# Altium footprint library connector.PcbLib: 209 footprints (part 7 of 14)
Each footprint in its own frame and in the unit in brackets; x right, y up, seen from the top. Pads: shape width x height; smd on the part's side, far side on the other; paste and mask are expansions set on the pad; w line width, h text height; cw(c..) or ccw(c..) is an arc to the next point about the centre after c.
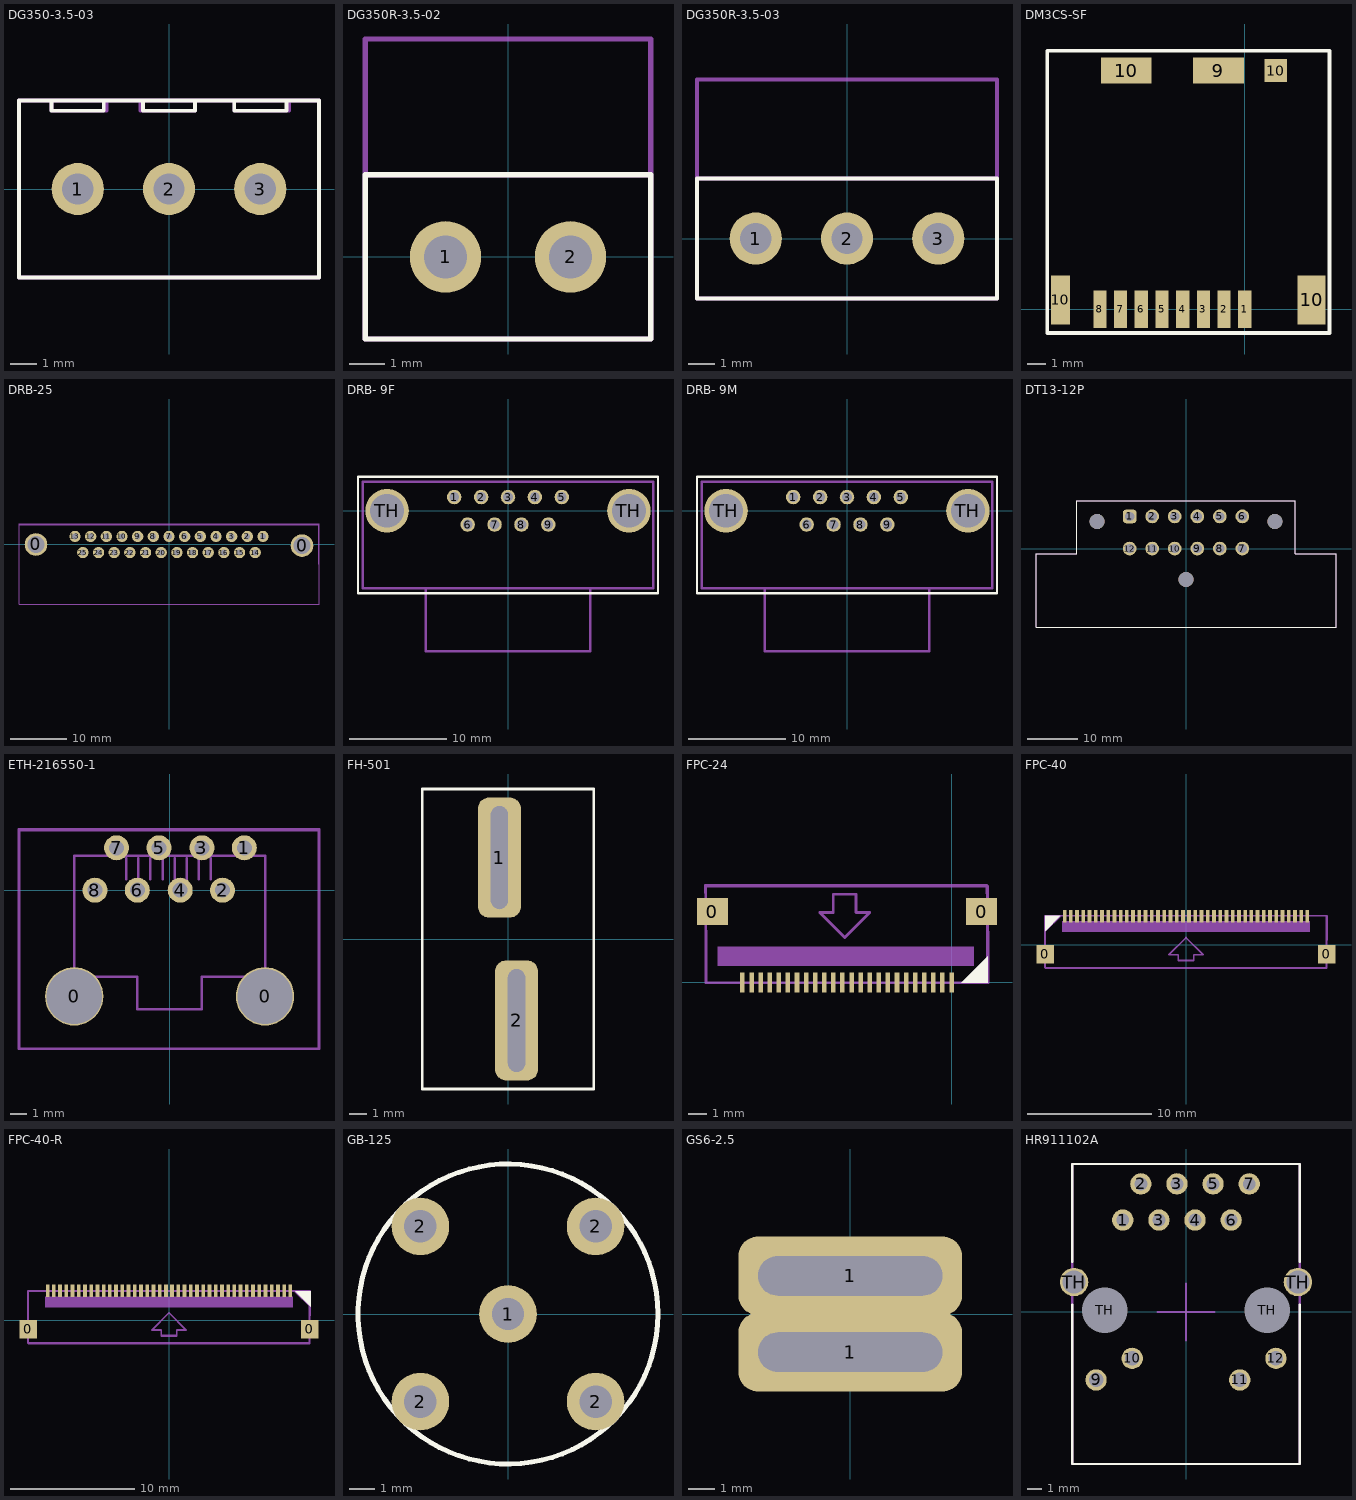
[diagram p6: the footprints below, top view; thin cyan lines are the x and y axes]

## DG350-3.5-03 [mm]
height 10
pads (3):
  round 2 hole 1.2: 1(-3.5,0) 2(0,0) 3(3.5,0)
Top Overlay:
  lines w0.15: -4.5,3.4 -4.5,3 -2.5,3 -2.5,3.4 ; -1,3.4 -1,3 1,3 1,3.4 ; 2.5,3.4 2.5,3 4.5,3 4.5,3.4 ; -5.75,-3.4 5.75,-3.4 5.75,3.4 -5.75,3.4 -5.75,-3.4
Mechanical 29:
  lines w0.15: -4.5,3.4 -4.5,3 -2.4,3 -2.4,3.4 ; -1.1,3.4 -1.1,3 1,3 1,3.4 ; 2.5,3.4 2.5,3 4.6,3 4.6,3.4 ; -5.75,-3.4 -5.75,3.4 5.75,3.4 5.75,-3.4 -5.75,-3.4
  text ".Designator" at -3.5,-0.3 h1
3D body "DG350-3,5-02P.step": height 8.4, standoff -3.4, extent -5.75,-3.4 2.25,3.4
3D body "DG350-3,5-02P.step": height 8.4, standoff -3.4, extent -2.25,-3.4 5.75,3.4

## DG350R-3.5-02 [mm]
height 7
pads (2):
  round 2 hole 1.2: 1(-1.75,0) 2(1.75,0)
Top Overlay:
  lines w0.15: -4,-2.3 4,-2.3 4,2.3 -4,2.3 -4,-2.3
Mechanical 29:
  lines w0.15: -4,2.3 4,2.3 ; -4,-2.3 4,-2.3 4,6.1 -4,6.1 -4,-2.3
  text ".Designator" at -3,-0.3 h1

## DG350R-3.5-03 [mm]
height 7
pads (3):
  round 2 hole 1.2: 1(-3.5,0) 2(0,0) 3(3.5,0)
Top Overlay:
  lines w0.15: -5.75,-2.3 -5.75,2.3 5.75,2.3 5.75,-2.3 -5.75,-2.3
Mechanical 29:
  lines w0.15: -5.75,2.3 5.75,2.3 ; -5.75,-2.3 -5.75,6.1 5.75,6.1 5.75,-2.3 -5.75,-2.3
  text ".Designator" at -3.5,-0.3 h1

## DM3CS-SF [mm] "Hirose,  10 (8 + 2) Position Card Connector Secure Digital - microSDпїЅ Surface Mount, Right Angle Gold"
height 1.83
pads (13):
  rect 0.7x2 smd: 1(0,0) 2(-1.1,0) 3(-2.2,0) 4(-3.3,0) 5(-4.4,0) 6(-5.5,0) 7(-6.6,0) 8(-7.7,0)
  rect 2.7x1.4 smd: 9(-1.4,12.7) 10(-6.3,12.7)
  rect 1x2.6 smd: 10(-9.8,0.5)
  rect 1.2x1.2 smd: 10(1.65,12.7)
  rect 1.5x2.6 smd: 10(3.55,0.5)
Top Overlay:
  lines w0.2: -10.5,-1.25 4.5,-1.25 4.5,13.75 -10.5,13.75 -10.5,-1.25
3D body "DM3CS-SF.stp": height 1.93, standoff 0, extent -9.9,-0.727 3.9,13.373

## DRB-25 [mm]
height 12.5
pads (27):
  round 4 hole 3: 0(-23.52,0) 0(23.52,-0.2)
  round 2 hole 1: 1(16.62,1.42) 2(13.85,1.42) 3(11.08,1.42) 4(8.31,1.42) 5(5.54,1.42) 6(2.77,1.42) 7(0,1.42) 8(-2.77,1.42) 9(-5.54,1.42) 10(-8.31,1.42) 11(-11.08,1.42) 12(-13.85,1.42) 13(-16.62,1.42) 14(15.24,-1.42) 15(12.47,-1.42) 16(9.7,-1.42) 17(6.93,-1.42) 18(4.16,-1.42) 19(1.39,-1.42) 20(-1.38,-1.42) 21(-4.15,-1.42) 22(-6.92,-1.42) 23(-9.69,-1.42) 24(-12.46,-1.42) 25(-15.23,-1.42)
Mechanical 29:
  lines w0.15: -26.5,-3.5 -26.5,3.5 26.5,3.5 26.5,-3.5 ; -26.52,-10.6 -26.52,3.7 26.52,3.7 26.52,-10.6 -26.52,-10.6
  text ".Designator" at -3.5,-3.8 h1
3D body "DB-25S-1A5N-A191-A197.STEP": height 13.77, standoff -3.48, extent -26.55,-17.13 26.55,3.4

## DRB- 9F [mm]
height 12.5
pads (11):
  round 1.5 hole 1: 1(-5.56,1.42) 2(-2.78,1.42) 3(0,1.42) 4(2.78,1.42) 5(5.56,1.42) 6(-4.17,-1.42) 7(-1.39,-1.42) 8(1.39,-1.42) 9(4.17,-1.42)
  round 4.5 hole 3.5: TH(-12.5,0) TH(12.5,0)
Top Overlay:
  lines w0.254: -15.5,-8.5 -15.5,3.5 15.5,3.5 15.5,-8.5 -15.5,-8.5
Mechanical 29:
  lines w0.254: -8.5,-8 -8.5,-14.5 8.5,-14.5 8.5,-8 ; -15,-8 -15,3 15,3 15,-8 -15,-8
  text ".Designator" at -6,-6 h1.52
3D body "DB-9F.step": height 12.75, standoff -3.65, extent -15.25,-13.5 15.25,3.2

## DRB- 9M [mm]
height 12.5
pads (11):
  round 1.5 hole 1: 1(-5.56,1.42) 2(-2.78,1.42) 3(0,1.42) 4(2.78,1.42) 5(5.56,1.42) 6(-4.17,-1.42) 7(-1.39,-1.42) 8(1.39,-1.42) 9(4.17,-1.42)
  round 4.5 hole 3.5: TH(-12.5,0) TH(12.5,0)
Top Overlay:
  lines w0.254: -15.5,-8.5 -15.5,3.5 15.5,3.5 15.5,-8.5 -15.5,-8.5
Mechanical 29:
  lines w0.254: -8.5,-8 -8.5,-14.5 8.5,-14.5 8.5,-8 ; -15,-8 -15,3 15,3 15,-8 -15,-8
  text ".Designator" at -6,-6 h1.52
3D body "DRB-9MB.STEP": height 12.6, standoff -3.2, extent -15.4,-16.4 15.4,3.4

## DT13-12P [mm]
pads (15):
  rrect50% 2.715x2.715 hole 1.81: 1(-11.115,6.35)
  round 2.715 hole 1.81: 2(-6.67,6.35) 3(-2.225,6.35) 4(2.225,6.35) 5(6.67,6.35) 6(11.115,6.35) 7(11.115,0) 8(6.67,0) 9(2.225,0) 10(-2.225,0) 11(-6.67,0) 12(-11.115,0)
  round 2.99 hole 2.99 unplated: ""(-17.54,5.34) ""(0,-6.1) ""(17.54,5.34)
Top Overlay:
  lines w0.15: -29.605,-15.49 -20.28,-15.49 20.28,-15.49 29.605,-15.49 29.605,-1 21.605,-1 21.605,9.4 -21.605,9.4 -21.605,-1 -29.605,-1 -29.605,-15.49
  text "." at -11.521,10.029 h0.1
Top Courtyard:
  lines w0.127: -29.605,-15.49 -20.28,-15.49 20.28,-15.49 29.605,-15.49 29.605,-1 21.605,-1 21.605,9.4 -21.605,9.4 -21.605,-1 -29.605,-1 -29.605,-15.49
3D body "c-dt13-12pb-d-3d.stp": height 33.65, standoff -4.98, extent -29.577,-30.312 29.605,9.312

## ETH-216550-1 [mm]
pads (10):
  round 3.5 hole 3.3: 0(-5.715,-6.36) 0(5.715,-6.36)
  round 1.5 hole 0.9: 1(4.475,2.54) 2(3.175,0) 3(1.935,2.54) 4(0.635,0) 5(-0.635,2.54) 6(-1.935,0) 7(-3.175,2.54) 8(-4.475,0)
Mechanical 29:
  lines w0.15: -2.6,0.65 -2.6,1.925 ; -1.875,0.65 -1.875,1.925 ; -1.15,0.65 -1.15,1.925 ; -0.425,0.65 -0.425,1.925 ; 0.3,0.65 0.3,1.925 ; 1.025,0.65 1.025,1.925 ; 1.75,0.65 1.75,1.925 ; 2.475,0.65 2.475,1.925 ; -9.025,-9.5 8.95,-9.5 ; -9.025,-9.5 -9.025,3.6 8.95,3.6 8.95,-9.5 ; -9.025,-9.5 8.95,-9.5 ; -9.025,-9.5 -9.025,3.65 8.95,3.65 8.95,-9.5 ; -5.715,-5.2 -1.935,-5.2 -1.935,-7.125 1.935,-7.125 1.935,-5.2 5.715,-5.2 5.715,2.05 -5.715,2.05 -5.715,-5.2
  text ".Designator" at -3.5,-2.8 h1
3D body "c-216550-1.STEP": height 16.5, standoff -3.1, extent -9.05,-9.625 8.95,3.075

## FH-501 [mm]
pads (2):
  rrect50% 2.5x7 hole 6 slot 1 at 0 deg: 1(-0.5,4.75) 2(0.5,-4.75)
Top Overlay:
  lines w0.15: -5,-8.75 5,-8.75 5,8.75 -5,8.75 -5,-8.75
3D body "FH-501.stp": height 15, standoff -7, extent -5,-18.5 5,19

## FPC-24 [mm]
pads (26):
  rect 1.7x1.5 smd: 0(-13.15,3.9) 0(1.65,3.9)
  rect 0.25x1.1 smd: 1(0,0) 2(-0.5,0) 3(-1,0) 4(-1.5,0) 5(-2,0) 6(-2.5,0) 7(-3,0) 8(-3.5,0) 9(-4,0) 10(-4.5,0) 11(-5,0) 12(-5.5,0) 13(-6,0) 14(-6.5,0) 15(-7,0) 16(-7.5,0) 17(-8,0) 18(-8.5,0) 19(-9,0) 20(-9.5,0) 21(-10,0) 22(-10.5,0) 23(-11,0) 24(-11.5,0)
Top Overlay:
  region: 0.525,-0.025 2,-0.025 2,1.45
Mechanical 29:
  rectangle: -12.875,0.9 1.225,1.975
  region: 2,1.275 1.975,1.25 1.975,-0.025 0.7,-0.025
  lines w0.15: -13.55,4.925 -13.55,5.325 1.95,5.325 1.95,4.9 ; -13.5,2.85 -13.5,-0.025 -11.825,-0.025 ; 0.325,-0.025 2,-0.025 2,2.8 ; -7.25,3.85 -5.875,2.475 ; -7.25,3.85 -6.5,3.85 ; -7.25,3.85 -5.875,2.475 ; -7.25,3.85 -6.5,3.85 ; -6.5,3.85 -6.5,4.85 ; -6.5,3.85 -6.5,4.85 ; -6.5,4.85 -5.25,4.85 ; -6.5,4.85 -5.25,4.85 ; -5.875,2.475 -4.5,3.85 ; -5.875,2.475 -4.5,3.85 ; -5.25,3.85 -5.25,4.85 ; -5.25,3.85 -4.5,3.85 ; -5.25,3.85 -5.25,4.85 ; -5.25,3.85 -4.5,3.85 ; -13.525,-0.025 -13.525,5.3 1.975,5.3 1.975,-0.025 -13.525,-0.025
  text ".Designator" at -12.5,3.2 h1

## FPC-40 [mm]
pads (42):
  rect 1.4x1.5 smd: 0(-11.3,-0.75) 0(11.3,-0.75)
  rect 0.3x1 smd: 1(-9.75,2.3) 2(-9.25,2.3) 3(-8.75,2.3) 4(-8.25,2.3) 5(-7.75,2.3) 6(-7.25,2.3) 7(-6.75,2.3) 8(-6.25,2.3) 9(-5.75,2.3) 10(-5.25,2.3) 11(-4.75,2.3) 12(-4.25,2.3) 13(-3.75,2.3) 14(-3.25,2.3) 15(-2.75,2.3) 16(-2.25,2.3) 17(-1.75,2.3) 18(-1.25,2.3) 19(-0.75,2.3) 20(-0.25,2.3) 21(0.25,2.3) 22(0.75,2.3) 23(1.25,2.3) 24(1.75,2.3) 25(2.25,2.3) 26(2.75,2.3) 27(3.25,2.3) 28(3.75,2.3) 29(4.25,2.3) 30(4.75,2.3) 31(5.25,2.3) 32(5.75,2.3) 33(6.25,2.3) 34(6.75,2.3) 35(7.25,2.3) 36(7.75,2.3) 37(8.25,2.3) 38(8.75,2.3) 39(9.25,2.3) 40(9.75,2.3)
Top Overlay:
  region: -11.325,1.1 -11.325,2.325 -10.1,2.325
Mechanical 29:
  region: 9.95,1.9 -9.975,1.9 -9.975,1.025 9.95,1.025
  region: -11.3,1.025 -11.275,1.05 -11.275,2.325 -10,2.325
  lines w0.15: -11.325,0.375 -11.325,2.325 ; -11.3,-1.875 -0.55,-1.875 11.3,-1.875 ; -10.2,2.325 -11.325,2.325 ; 10.2,2.325 11.325,2.325 11.325,0.375 ; -11.325,2.325 11.3,2.325 11.3,-1.85 -11.325,-1.85 -11.325,2.325 ; -1.375,-0.8 -0.625,-0.8 ; -1.375,-0.8 0,0.575 ; -1.375,-0.8 -0.625,-0.8 ; -1.375,-0.8 0,0.575 ; -0.625,-0.8 -0.625,-1.275 0.625,-1.275 0.625,-0.8 ; -0.625,-0.8 -0.625,-1.25 0.625,-1.25 0.625,-0.8 ; 0,0.575 1.375,-0.8 ; 0,0.575 1.375,-0.8 ; 0.625,-0.8 1.375,-0.8 ; 0.625,-0.8 1.375,-0.8
  text ".Designator" at -8.5,-0.675 h1
3D body "FPC-40.STEP": height 1.2, standoff -0.02, extent -11.025,-0.95 10.975,2.05

## FPC-40-R [mm]
pads (42):
  rect 1.4x1.5 smd: 0(-11.3,-0.75) 0(11.3,-0.75)
  rect 0.3x1 smd: 1(9.75,2.35) 2(9.25,2.35) 3(8.75,2.35) 4(8.25,2.35) 5(7.75,2.35) 6(7.25,2.35) 7(6.75,2.35) 8(6.25,2.35) 9(5.75,2.35) 10(5.25,2.35) 11(4.75,2.35) 12(4.25,2.35) 13(3.75,2.35) 14(3.25,2.35) 15(2.75,2.35) 16(2.25,2.35) 17(1.75,2.35) 18(1.25,2.35) 19(0.75,2.35) 20(0.25,2.35) 21(-0.25,2.35) 22(-0.75,2.35) 23(-1.25,2.35) 24(-1.75,2.35) 25(-2.25,2.35) 26(-2.75,2.35) 27(-3.25,2.35) 28(-3.75,2.35) 29(-4.25,2.35) 30(-4.75,2.35) 31(-5.25,2.35) 32(-5.75,2.35) 33(-6.25,2.35) 34(-6.75,2.35) 35(-7.25,2.35) 36(-7.75,2.35) 37(-8.25,2.35) 38(-8.75,2.35) 39(-9.25,2.35) 40(-9.75,2.35)
Top Overlay:
  region: 10.142,2.308 11.367,2.308 11.367,1.083
Mechanical 29:
  region: 9.95,1.9 -9.975,1.9 -9.975,1.025 9.95,1.025
  region: 10.067,2.283 10.092,2.258 11.367,2.258 11.367,0.983
  lines w0.15: -11.325,0.375 -11.325,2.325 ; -11.3,-1.875 -0.55,-1.875 11.3,-1.875 ; -10.2,2.325 -11.325,2.325 ; 10.2,2.325 11.325,2.325 11.325,0.375 ; -11.325,2.325 11.3,2.325 11.3,-1.85 -11.325,-1.85 -11.325,2.325 ; -1.375,-0.8 -0.625,-0.8 ; -1.375,-0.8 0,0.575 ; -1.375,-0.8 -0.625,-0.8 ; -1.375,-0.8 0,0.575 ; -0.625,-0.8 -0.625,-1.25 0.625,-1.25 0.625,-0.8 ; -0.625,-0.8 -0.625,-1.275 0.625,-1.275 0.625,-0.8 ; 0,0.575 1.375,-0.8 ; 0,0.575 1.375,-0.8 ; 0.625,-0.8 1.375,-0.8 ; 0.625,-0.8 1.375,-0.8
  text ".Designator" at -10,-0.8 h1
3D body "FPC-40.STEP": height 1.2, standoff -0.02, extent -11.025,-0.95 10.975,2.05

## GB-125 [mm]
pads (5):
  round 2.3 hole 1.3: 1(0,0) 2(-3.5,-3.5) 2(-3.5,3.5) 2(3.5,-3.5) 2(3.5,3.5)
Top Overlay:
  circle w0.2: c0,0 r6
3D body: height 19, standoff 0, extent -5.5,-5.5 5.5,5.5

## GS6-2.5 [mm]
pads (2):
  rrect50% 8.5x3 hole 1.5 slot 7 at 0 deg: 1(0,-1.45) 1(0,1.45)
Multi-Layer:
  pour cut-out: -4.5,3 -3,3 -3,-3 -4.5,-3
3D body "GS6-2.5.STEP": height 1.15, standoff -2.75, extent -16.5,-5 2.5,5

## HR911102A [mm]
height 14
pads (16):
  round 1.5 hole 0.9: 1(-4.445,6.46) 2(-3.175,9) 3(-1.905,6.46) 3(-0.635,9) 4(0.635,6.46) 5(1.905,9) 6(3.175,6.46) 7(4.445,9)
  round 1.5 hole 1.02: 9(-6.325,-4.79) 10(-3.785,-3.27) 11(3.785,-4.79) 12(6.325,-3.27)
  round 2 hole 1.6: TH(-7.875,2.1) TH(7.875,2.1)
  round 1.5 hole 3.2 unplated: TH(-5.715,0.11) TH(5.715,0.11)
Top Overlay:
  lines w0.15: -8,0.5 -8,-10.7 8,-10.7 8,0.5 ; -8,3.5 -8,10.4 8,10.4 8,3.5
Mechanical 15:
  lines w0.15: -2,0 2,0 ; 0,-2 0,2
Mechanical 29:
  lines w0.15: -8,-10.7 -8,10.4 8,10.4 8,-10.7 -8,-10.7
  text ".Designator" at -3.5,-0.8 h1
3D body: height 14, standoff 0.5, extent -8.075,-10.775 8.075,10.475
3D body: height 4, standoff 1.5, extent -6.5,-10.9 -3,-10.4
3D body: height 4, standoff 1.5, extent 3,-10.9 6.5,-10.4